# Altium footprint library MyPcbLib.PcbLib: 657 footprints (part 24 of 42)
Each footprint in its own frame and in the unit in brackets; x right, y up, seen from the top. Pads: shape width x height; smd on the part's side, far side on the other; paste and mask are expansions set on the pad; w line width, h text height; cw(c..) or ccw(c..) is an arc to the next point about the centre after c.
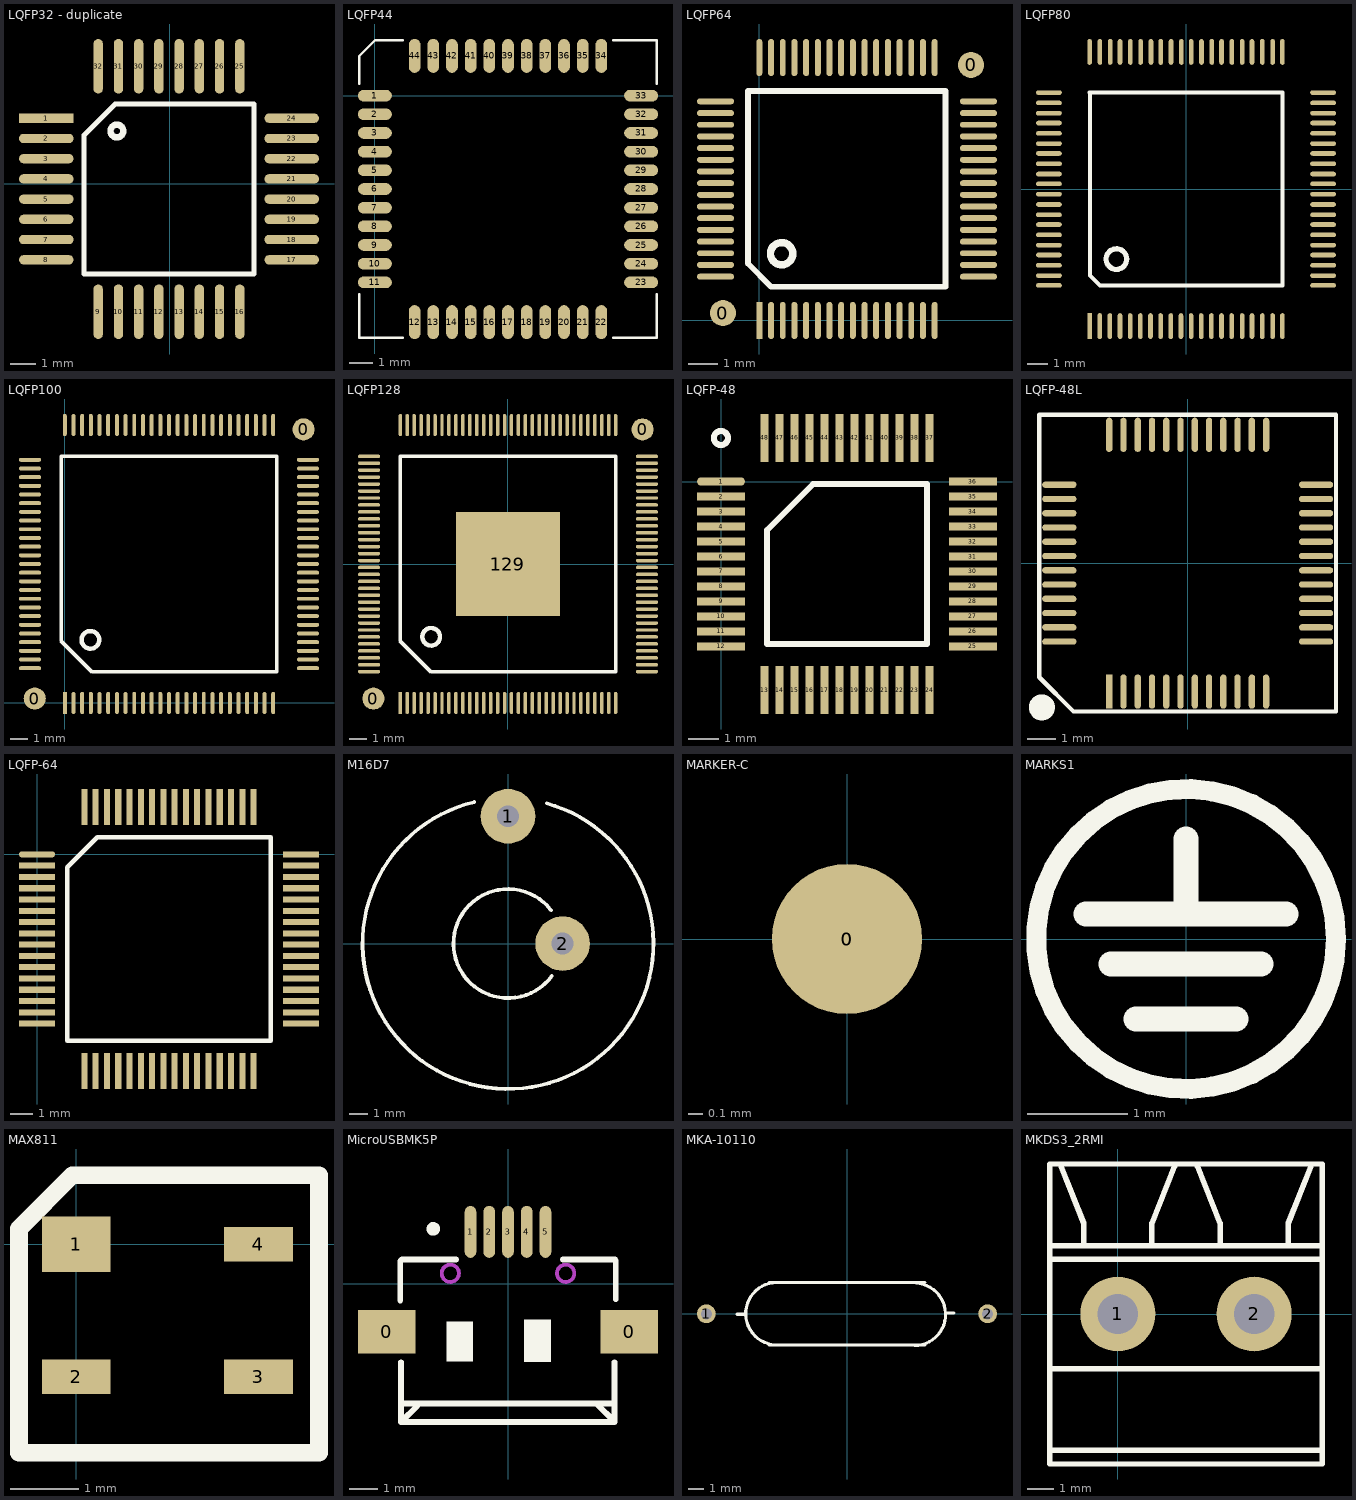
[diagram p23: the footprints below, top view; thin cyan lines are the x and y axes]

## LQFP32 - duplicate [mil]
pads (32):
  rect 85x14.57 smd: 1(-192,102)
  oval 85x14.57 smd: 2(-192,70.5) 3(-192,39.01) 4(-192,7.51) 5(-192,-23.98) 6(-192,-55.48) 7(-192,-86.98) 8(-192,-118.47) 17(190.21,-118.47) 18(190.21,-86.98) 19(190.21,-55.48) 20(190.21,-23.98) 21(190.21,7.51) 22(190.21,39.01) 23(190.21,70.5) 24(190.21,102)
  oval 14.57x85 smd: 9(-111.13,-199.34) 10(-79.64,-199.34) 11(-48.14,-199.34) 12(-16.65,-199.34) 13(14.85,-199.34) 14(46.35,-199.34) 15(77.84,-199.34) 16(109.34,-199.34) 25(109.34,182.87) 26(77.84,182.87) 27(46.35,182.87) 28(14.85,182.87) 29(-16.65,182.87) 30(-48.14,182.87) 31(-79.64,182.87) 32(-111.13,182.87)
Top Overlay:
  circle w10: c-82,82 r10
  lines w0.98: -133.38,-140.72 131.58,-140.72 131.58,124.24 -84.76,124.24 -133.38,75.62 -133.38,-140.72
  lines w8: -133.38,-140.72 131.58,-140.72 131.58,124.24 -84.76,124.24 -133.38,75.62 -133.38,-140.72

## LQFP44 [mm]
pads (44):
  oval 1.45x0.5 smd: 1(0,0) 2(0,-0.8) 3(0,-1.6) 4(0,-2.4) 5(0,-3.2) 6(0,-4) 7(0,-4.8) 8(0,-5.6) 9(0,-6.4) 10(0,-7.2) 11(0,-8) 23(11.4,-8) 24(11.4,-7.2) 25(11.4,-6.4) 26(11.4,-5.6) 27(11.4,-4.8) 28(11.4,-4) 29(11.4,-3.2) 30(11.4,-2.4) 31(11.4,-1.6) 32(11.4,-0.8) 33(11.4,0)
  oval 0.5x1.45 smd: 12(1.7,-9.7) 13(2.5,-9.7) 14(3.3,-9.7) 15(4.1,-9.7) 16(4.9,-9.7) 17(5.7,-9.7) 18(6.5,-9.7) 19(7.3,-9.7) 20(8.1,-9.7) 21(8.9,-9.7) 22(9.7,-9.7) 34(9.7,1.7) 35(8.9,1.7) 36(8.1,1.7) 37(7.3,1.7) 38(6.5,1.7) 39(5.7,1.7) 40(4.9,1.7) 41(4.1,1.7) 42(3.3,1.7) 43(2.5,1.7) 44(1.7,1.7)
Top Overlay:
  lines w0.1: -0.675,-8.5 -0.675,-10.375 1.2,-10.375 ; -0.675,0.5 -0.675,1.7 0,2.375 1.2,2.375 ; 10.2,-10.375 12.075,-10.375 12.075,-8.5 ; 10.2,2.375 12.075,2.375 12.075,0.5
3D body: height 1.5, standoff 0.02, extent -0.285,-9.988 11.715,2.012

## LQFP64 [mm]
pads (66):
  round 0.889 smd: 0(-1.246,0.254) 0(7.246,8.746)
  rect 0.203x1.27 smd: 1(0,0)
  oval 0.203x1.27 smd: 2(0.4,0) 3(0.8,0) 4(1.2,0) 5(1.6,0) 6(2,0) 7(2.4,0) 8(2.8,0) 9(3.2,0) 10(3.6,0) 11(4,0) 12(4.4,0) 13(4.8,0) 14(5.2,0) 15(5.6,0) 16(6,0) 33(6,9) 34(5.6,9) 35(5.2,9) 36(4.8,9) 37(4.4,9) 38(4,9) 39(3.6,9) 40(3.2,9) 41(2.8,9) 42(2.4,9) 43(2,9) 44(1.6,9) 45(1.2,9) 46(0.8,9) 47(0.4,9) 48(0,9)
  oval 1.27x0.203 smd: 17(7.5,1.5) 18(7.5,1.9) 19(7.5,2.3) 20(7.5,2.7) 21(7.5,3.1) 22(7.5,3.5) 23(7.5,3.9) 24(7.5,4.3) 25(7.5,4.7) 26(7.5,5.1) 27(7.5,5.5) 28(7.5,5.9) 29(7.5,6.3) 30(7.5,6.7) 31(7.5,7.1) 32(7.5,7.5) 49(-1.5,7.5) 50(-1.5,7.1) 51(-1.5,6.7) 52(-1.5,6.3) 53(-1.5,5.9) 54(-1.5,5.5) 55(-1.5,5.1) 56(-1.5,4.7) 57(-1.5,4.3) 58(-1.5,3.9) 59(-1.5,3.5) 60(-1.5,3.1) 61(-1.5,2.7) 62(-1.5,2.3) 63(-1.5,1.9) 64(-1.5,1.5)
Top Overlay:
  circle w0.254: c0.762,2.286 r0.381
  lines w0.2: -0.392,1.947 0.402,1.154
  lines w0.203: -0.392,1.947 -0.392,7.859 6.365,7.859 6.365,1.154 0.402,1.154

## LQFP80 [mil]
pads (80):
  rect 9x50 smd: 1(-187,-266)
  oval 9x50 smd: 2(-167.31,-266) 3(-147.63,-266) 4(-127.94,-266) 5(-108.26,-266) 6(-88.57,-266) 7(-68.89,-266) 8(-49.2,-266) 9(-29.52,-266) 10(-9.83,-266) 11(9.85,-266) 12(29.54,-266) 13(49.22,-266) 14(68.91,-266) 15(88.59,-266) 16(109,-266) 17(128,-266) 18(148,-266) 19(168,-266) 20(187,-266) 41(187,266) 42(168,266) 43(148,266) 44(128,266) 45(109,266) 46(89,266) 47(69,266) 48(50,266) 49(30,266) 50(10,266) 51(-9,266) 52(-29,266) 53(-49,266) 54(-68,266) 55(-88,266) 56(-108,266) 57(-128,266) 58(-147,266) 59(-167,266) 60(-187,266)
  oval 50x9 smd: 21(266,-187) 22(266,-168) 23(266,-148) 24(266,-128) 25(266,-109) 26(266,-89) 27(266,-69) 28(266,-50) 29(266,-30) 30(266,-10) 31(266,10) 32(266,29) 33(266,49) 34(266,69) 35(266,88) 36(266,108) 37(266,128) 38(266,147) 39(266,167) 40(266,187) 61(-266,187) 62(-266,167) 63(-266,147) 64(-266,128) 65(-266,108) 66(-266,88) 67(-266,69) 68(-266,49) 69(-266,29) 70(-266,10) 71(-266,-10) 72(-266,-30) 73(-266,-50) 74(-266,-69) 75(-266,-89) 76(-266,-109) 77(-266,-128) 78(-266,-148) 79(-266,-168) 80(-266,-187)
Top Overlay:
  circle w10: c-135,-136 r20
  lines w8: -187,187 187,187 187,-187 -167,-187 -186,-168 -186,187

## LQFP100 [mm]
pads (102):
  round 1.27 smd: 0(-1.727,0.254) 0(13.746,15.748)
  rect 0.229x1.27 smd: 1(0,0)
  oval 0.229x1.27 smd: 2(0.5,0) 3(1,0) 4(1.5,0) 5(2,0) 6(2.5,0) 7(3,0) 8(3.5,0) 9(4,0) 10(4.5,0) 11(5,0) 12(5.5,0) 13(6,0) 14(6.5,0) 15(7,0) 16(7.5,0) 17(8,0) 18(8.5,0) 19(9,0) 20(9.5,0) 21(10,0) 22(10.5,0) 23(11,0) 24(11.5,0) 25(12,0) 51(12,16) 52(11.5,16) 53(11,16) 54(10.5,16) 55(10,16) 56(9.5,16) 57(9,16) 58(8.5,16) 59(8,16) 60(7.5,16) 61(7,16) 62(6.5,16) 63(6,16) 64(5.5,16) 65(5,16) 66(4.5,16) 67(4,16) 68(3.5,16) 69(3,16) 70(2.5,16) 71(2,16) 72(1.5,16) 73(1,16) 74(0.5,16) 75(0,16)
  oval 1.27x0.229 smd: 26(14,2) 27(14,2.5) 28(14,3) 29(14,3.5) 30(14,4) 31(14,4.5) 32(14,5) 33(14,5.5) 34(14,6) 35(14,6.5) 36(14,7) 37(14,7.5) 38(14,8) 39(14,8.5) 40(14,9) 41(14,9.5) 42(14,10) 43(14,10.5) 44(14,11) 45(14,11.5) 46(14,12) 47(14,12.5) 48(14,13) 49(14,13.5) 50(14,14) 76(-2,14) 77(-2,13.5) 78(-2,13) 79(-2,12.5) 80(-2,12) 81(-2,11.5) 82(-2,11) 83(-2,10.5) 84(-2,10) 85(-2,9.5) 86(-2,9) 87(-2,8.5) 88(-2,8) 89(-2,7.5) 90(-2,7) 91(-2,6.5) 92(-2,6) 93(-2,5.5) 94(-2,5) 95(-2,4.5) 96(-2,4) 97(-2,3.5) 98(-2,3) 99(-2,2.5) 100(-2,2)
Top Overlay:
  circle w0.254: c1.473,3.632 r0.508
  lines w0.2: -0.215,3.57 1.57,1.785 12.215,1.785 12.215,14.215 -0.215,14.215 -0.215,3.57

## LQFP128 [mm]
pads (131):
  round 1.27 smd: 0(-7.746,-7.746) 0(7.746,7.746)
  rect 0.2x1.27 smd: 1(-6.2,-8)
  oval 0.2x1.27 smd: 2(-5.8,-8) 3(-5.4,-8) 4(-5,-8) 5(-4.6,-8) 6(-4.2,-8) 7(-3.8,-8) 8(-3.4,-8) 9(-3,-8) 10(-2.6,-8) 11(-2.2,-8) 12(-1.8,-8) 13(-1.4,-8) 14(-1,-8) 15(-0.6,-8) 16(-0.2,-8) 17(0.2,-8) 18(0.6,-8) 19(1,-8) 20(1.4,-8) 21(1.8,-8) 22(2.2,-8) 23(2.6,-8) 24(3,-8) 25(3.4,-8) 26(3.8,-8) 27(4.2,-8) 28(4.6,-8) 29(5,-8) 30(5.4,-8) 31(5.8,-8) 32(6.2,-8) 65(6.2,8) 66(5.8,8) 67(5.4,8) 68(5,8) 69(4.6,8) 70(4.2,8) 71(3.8,8) 72(3.4,8) 73(3,8) 74(2.6,8) 75(2.2,8) 76(1.8,8) 77(1.4,8) 78(1,8) 79(0.6,8) 80(0.2,8) 81(-0.2,8) 82(-0.6,8) 83(-1,8) 84(-1.4,8) 85(-1.8,8) 86(-2.2,8) 87(-2.6,8) 88(-3,8) 89(-3.4,8) 90(-3.8,8) 91(-4.2,8) 92(-4.6,8) 93(-5,8) 94(-5.4,8) 95(-5.8,8) 96(-6.2,8)
  oval 1.27x0.2 smd: 33(8,-6.2) 34(8,-5.8) 35(8,-5.4) 36(8,-5) 37(8,-4.6) 38(8,-4.2) 39(8,-3.8) 40(8,-3.4) 41(8,-3) 42(8,-2.6) 43(8,-2.2) 44(8,-1.8) 45(8,-1.4) 46(8,-1) 47(8,-0.6) 48(8,-0.2) 49(8,0.2) 50(8,0.6) 51(8,1) 52(8,1.4) 53(8,1.8) 54(8,2.2) 55(8,2.6) 56(8,3) 57(8,3.4) 58(8,3.8) 59(8,4.2) 60(8,4.6) 61(8,5) 62(8,5.4) 63(8,5.8) 64(8,6.2) 97(-8,6.2) 98(-8,5.8) 99(-8,5.4) 100(-8,5) 101(-8,4.6) 102(-8,4.2) 103(-8,3.8) 104(-8,3.4) 105(-8,3) 106(-8,2.6) 107(-8,2.2) 108(-8,1.8) 109(-8,1.4) 110(-8,1) 111(-8,0.6) 112(-8,0.2) 113(-8,-0.2) 114(-8,-0.6) 115(-8,-1) 116(-8,-1.4) 117(-8,-1.8) 118(-8,-2.2) 119(-8,-2.6) 120(-8,-3) 121(-8,-3.4) 122(-8,-3.8) 123(-8,-4.2) 124(-8,-4.6) 125(-8,-5) 126(-8,-5.4) 127(-8,-5.8) 128(-8,-6.2)
  rect 6x6 smd: 129(0,0)
Top Overlay:
  circle w0.254: c-4.422,-4.19 r0.508
  lines w0.2: -6.215,-4.43 -6.215,6.215 6.215,6.215 6.215,-6.215 -4.43,-6.215 -6.215,-4.43

## LQFP-48 [mm]
pads (48):
  oval 1.6x0.27 smd: 1(0,0)
  rect 1.6x0.27 smd: 2(0,-0.5) 3(0,-1) 4(0,-1.5) 5(0,-2) 6(0,-2.5) 7(0,-3) 8(0,-3.5) 9(0,-4) 10(0,-4.5) 11(0,-5) 12(0,-5.5) 25(8.4,-5.5) 26(8.4,-5) 27(8.4,-4.5) 28(8.4,-4) 29(8.4,-3.5) 30(8.4,-3) 31(8.4,-2.5) 32(8.4,-2) 33(8.4,-1.5) 34(8.4,-1) 35(8.4,-0.5) 36(8.4,0)
  rect 0.27x1.6 smd: 13(1.45,-6.95) 14(1.95,-6.95) 15(2.45,-6.95) 16(2.95,-6.95) 17(3.45,-6.95) 18(3.95,-6.95) 19(4.45,-6.95) 20(4.95,-6.95) 21(5.45,-6.95) 22(5.95,-6.95) 23(6.45,-6.95) 24(6.95,-6.95) 37(6.95,1.45) 38(6.45,1.45) 39(5.95,1.45) 40(5.45,1.45) 41(4.95,1.45) 42(4.45,1.45) 43(3.95,1.45) 44(3.45,1.45) 45(2.95,1.45) 46(2.45,1.45) 47(1.95,1.45) 48(1.45,1.45)
Top Overlay:
  circle w0.203: c0,1.45 r0.234
  lines w0.2: 1.535,-5.415 1.535,-1.62 3.07,-0.085 6.865,-0.085 6.865,-5.415 1.535,-5.415

## LQFP-48L [mm]
pads (48):
  rect 0.22x1.2 smd: 1(-2.75,-4.5)
  oval 0.22x1.2 smd: 2(-2.25,-4.5) 3(-1.75,-4.5) 4(-1.25,-4.5) 5(-0.75,-4.5) 6(-0.25,-4.5) 7(0.25,-4.5) 8(0.75,-4.5) 9(1.25,-4.5) 10(1.75,-4.5) 11(2.25,-4.5) 12(2.75,-4.5) 25(2.75,4.5) 26(2.25,4.5) 27(1.75,4.5) 28(1.25,4.5) 29(0.75,4.5) 30(0.25,4.5) 31(-0.25,4.5) 32(-0.75,4.5) 33(-1.25,4.5) 34(-1.75,4.5) 35(-2.25,4.5) 36(-2.75,4.5)
  oval 1.2x0.22 smd: 13(4.5,-2.75) 14(4.5,-2.25) 15(4.5,-1.75) 16(4.5,-1.25) 17(4.5,-0.75) 18(4.5,-0.25) 19(4.5,0.25) 20(4.5,0.75) 21(4.5,1.25) 22(4.5,1.75) 23(4.5,2.25) 24(4.5,2.75) 37(-4.5,2.75) 38(-4.5,2.25) 39(-4.5,1.75) 40(-4.5,1.25) 41(-4.5,0.75) 42(-4.5,0.25) 43(-4.5,-0.25) 44(-4.5,-0.75) 45(-4.5,-1.25) 46(-4.5,-1.75) 47(-4.5,-2.25) 48(-4.5,-2.75)
Top Overlay:
  lines w0.152: -5.2,-4 -5.2,5.2 5.2,5.2 5.2,-5.2 -4,-5.2 -5.2,-4
  lines w0.508: -5.166,-5.252 cw(c-5.114,-5.055) -5.131,-5.258
3D body: height 1.6, standoff 0, extent -4.488,-4.538 4.538,4.488

## LQFP-64 [mm]
pads (64):
  oval 1.6x0.27 smd: 1(0,0)
  rect 1.6x0.27 smd: 2(0,-0.5) 3(0,-1) 4(0,-1.5) 5(0,-2) 6(0,-2.5) 7(0,-3) 8(0,-3.5) 9(0,-4) 10(0,-4.5) 11(0,-5) 12(0,-5.5) 13(0,-6) 14(0,-6.5) 15(0,-7) 16(0,-7.5) 33(11.7,-7.5) 34(11.7,-7) 35(11.7,-6.5) 36(11.7,-6) 37(11.7,-5.5) 38(11.7,-5) 39(11.7,-4.5) 40(11.7,-4) 41(11.7,-3.5) 42(11.7,-3) 43(11.7,-2.5) 44(11.7,-2) 45(11.7,-1.5) 46(11.7,-1) 47(11.7,-0.5) 48(11.7,0)
  rect 0.27x1.6 smd: 17(2.1,-9.6) 18(2.6,-9.6) 19(3.1,-9.6) 20(3.6,-9.6) 21(4.1,-9.6) 22(4.6,-9.6) 23(5.1,-9.6) 24(5.6,-9.6) 25(6.1,-9.6) 26(6.6,-9.6) 27(7.1,-9.6) 28(7.6,-9.6) 29(8.1,-9.6) 30(8.6,-9.6) 31(9.1,-9.6) 32(9.6,-9.6) 49(9.6,2.1) 50(9.1,2.1) 51(8.6,2.1) 52(8.1,2.1) 53(7.6,2.1) 54(7.1,2.1) 55(6.6,2.1) 56(6.1,2.1) 57(5.6,2.1) 58(5.1,2.1) 59(4.6,2.1) 60(4.1,2.1) 61(3.6,2.1) 62(3.1,2.1) 63(2.6,2.1) 64(2.1,2.1)
Top Overlay:
  lines w0.2: 1.335,-8.265 1.335,-0.57 2.67,0.765 10.365,0.765 10.365,-8.265 1.335,-8.265

## M16D7 [mm]
pads (2):
  round 3 hole 1.2: 1(0,7) 2(3,0)
Top Overlay:
  lines w0.203: -1.854,7.782 ccw(c0,0) 2.137,7.709 ; 2.376,1.832 ccw(c0,0) 2.412,-1.784

## MARKER-C [mil]
height 150
pads (2):
  round 40 smd: 0(0,0)
  round 80 on Top Solder: 0(0,0)

## MARKS1 [mm]
Top Overlay:
  circle w0.2: c0,0 r1.5
  lines w0.254: -1,0.25 1,0.25 ; -0.75,-0.25 0.75,-0.25 ; -0.5,-0.8 0.5,-0.8 ; 0,0.25 0,1

## MAX811 [mm]
pads (4):
  rect 1x0.8 smd: 1(0.003,0.002)
  rect 1x0.5 smd: 2(0.003,-1.918) 3(2.643,-1.918) 4(2.643,0.002)
Top Overlay:
  lines w0.254: -0.827,-3.023 3.523,-3.023 3.523,1.002 -0.052,1.002 -0.827,0.227 -0.827,-3.023

## MicroUSBMK5P [mm]
pads (7):
  rect 2x1.5 smd: 0(-4.2,-1.658) 0(4.2,-1.658)
  oval 0.4x1.8 smd: 1(-1.3,1.8) 2(-0.65,1.8) 3(0,1.8) 4(0.65,1.8) 5(1.3,1.8)
Top Overlay:
  circle w0.254: c-2.591,1.905 r0.108
  rectangle: -2.134,-2.685 -1.219,-1.314
  rectangle: 0.559,-2.711 1.499,-1.237
  lines w0.203: -3.734,-0.584 -3.734,0.787 ; -3.708,-4.784 -3.708,-2.718 ; -3.708,-4.155 3.692,-4.155 ; -3.708,0.813 -3.676,0.845 -1.8,0.845 ; -3.683,-4.793 3.692,-4.793 3.692,-2.718 ; -3.683,-4.768 -3.15,-4.235 ; 1.905,0.838 3.708,0.838 ; 3.099,-4.184 3.683,-4.768 ; 3.734,-0.533 3.734,0.813
Keep-Out Layer:
  circle w0.127: c2,0.364 r0.3
  circle w0.127: c-2,0.364 r0.3
Mechanical 1:
  circle w0.127: c-2,0.364 r0.3
  circle w0.127: c2,0.364 r0.3

## MKA-10110 [mm]
pads (2):
  round 1.2 hole 0.7: 1(-9,0) 2(9,0)
Top Overlay:
  lines w0.203: -7.036,-0.025 -6.477,-0.025 ; -5,-2 5,-2 ; -5,2 5,2 ; -4.593,-1.99 cw(c-4.483,0.007) -4.496,2.007 ; 4.318,-2.032 ccw(c4.305,-0.032) 4.415,1.965 ; 6.325,0.051 6.858,0.051

## MKDS3_2RMI [mil]
pads (2):
  round 110 hole 59.05: 1(0,0) 2(200,0)
Top Overlay:
  lines w8: -100,-200 300,-200 ; -100,-80 300,-80 ; -100,80 300,80 ; -100,100 300,100 ; -83.33,216.67 -50,133.33 -50,100 ; 50,100 50,133.33 83.33,216.67 ; 116.67,216.67 150,133.33 150,100 ; 250,100 250,133.33 283.33,216.67 ; -100,-220 -100,220 300,220 300,-220 -100,-220
3D body: height 433.07, standoff -78.74, extent -96.85,-220 296.85,94.96